# Altium footprint library CeleronLib_SMD.PcbLib: 198 footprints (part 11 of 13)
Each footprint in its own frame and in the unit in brackets; x right, y up, seen from the top. Pads: shape width x height; smd on the part's side, far side on the other; paste and mask are expansions set on the pad; w line width, h text height; cw(c..) or ccw(c..) is an arc to the next point about the centre after c.
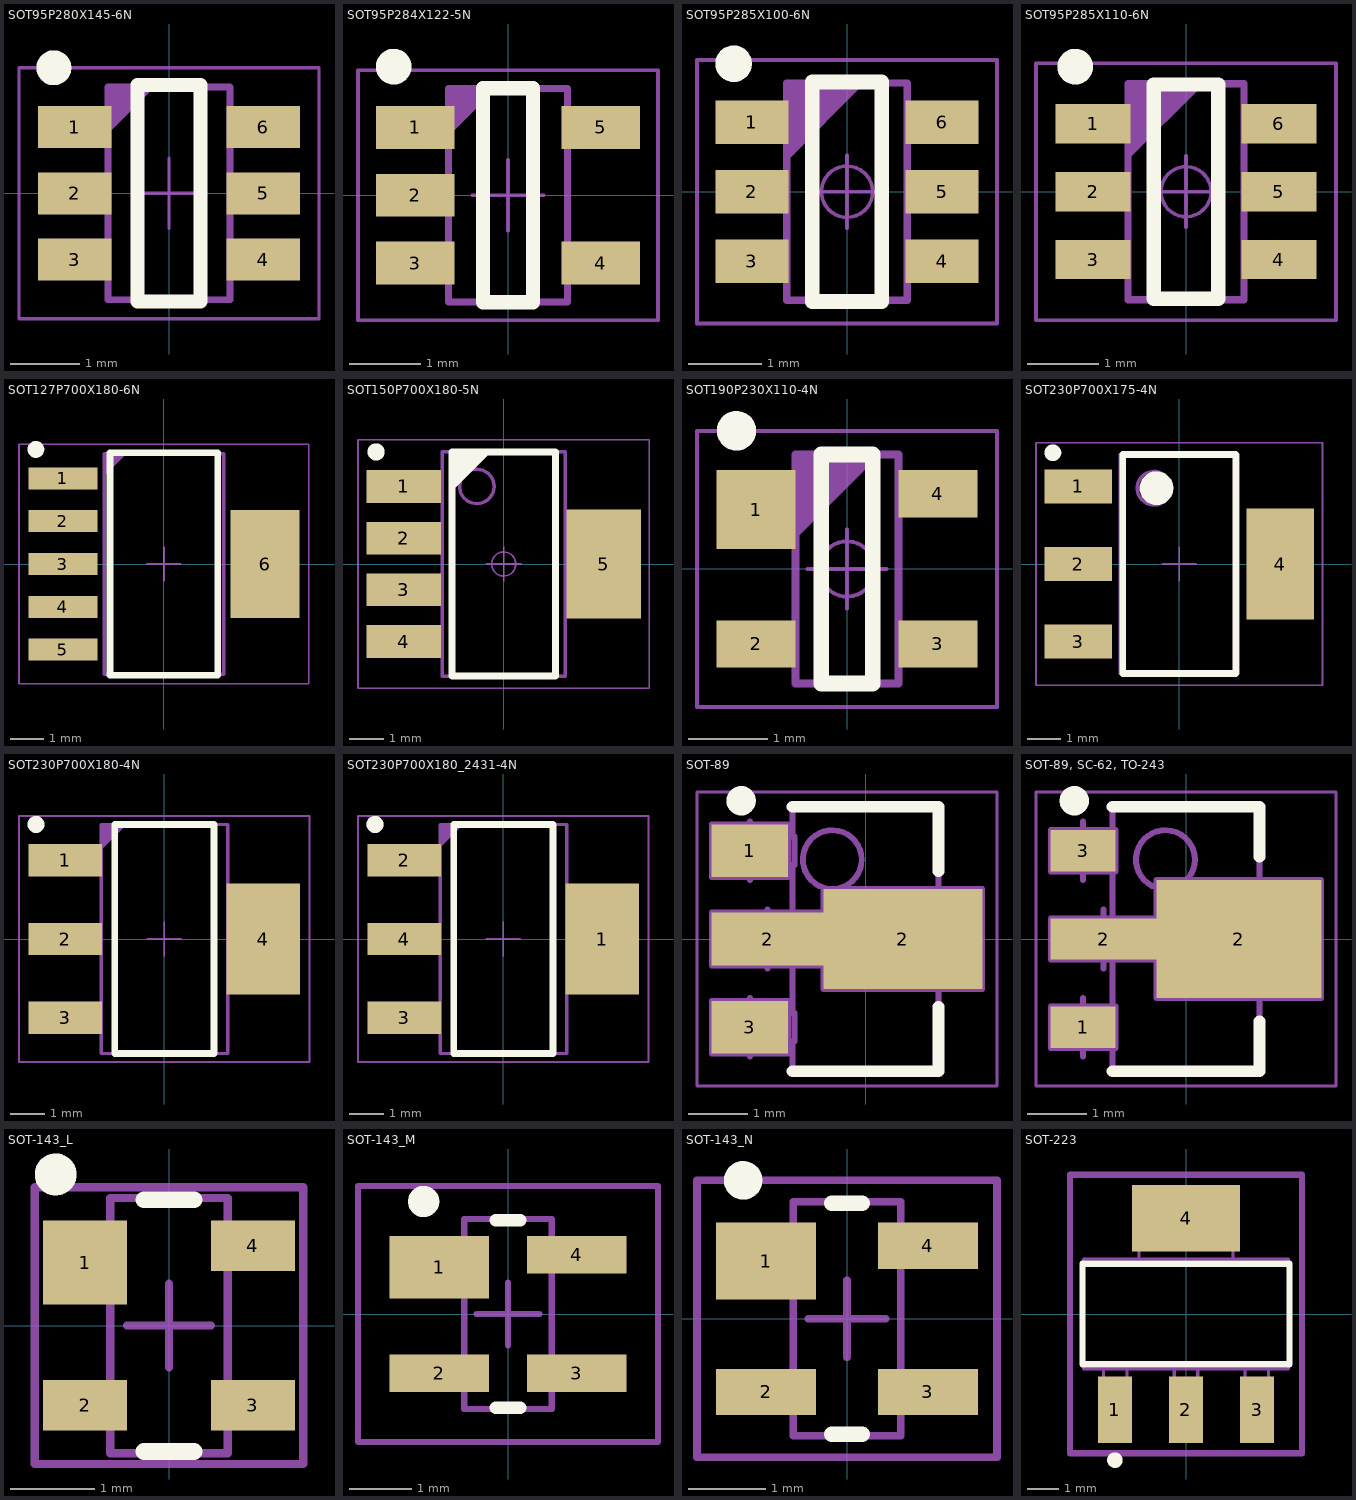
[diagram p10: the footprints below, top view; thin cyan lines are the x and y axes]

## SOT95P280X145-6N [mm] "SOT23, 6-Leads, Body 1.6x3.0mm, Pitch 0.95mm, IPC Medium Density"
height 1.45
pads (6):
  rect 1.05x0.6 smd: 1(-1.35,0.95) 2(-1.35,0) 3(-1.35,-0.95) 4(1.35,-0.95) 5(1.35,0) 6(1.35,0.95)
Top Overlay:
  circle w0.25: c-1.65,1.8 r0.125
  lines w0.2: -0.45,-1.55 0.45,-1.55 0.45,1.55 -0.45,1.55 -0.45,-1.55
Top Assy:
  lines w0.1: -0.875,0.925 -0.275,1.525 ; -0.875,1.025 -0.375,1.525 ; -0.875,1.125 -0.475,1.525 ; -0.875,1.225 -0.575,1.525 ; -0.875,1.325 -0.675,1.525 ; -0.875,1.425 -0.775,1.525 ; -0.875,-1.525 -0.875,1.525 0.875,1.525 0.875,-1.525 -0.875,-1.525
Top Courtyard:
  lines w0.05: -0.5,0 0.5,0 ; 0,-0.5 0,0.5 ; -2.15,-1.8 -2.15,1.8 2.15,1.8 2.15,-1.8 -2.15,-1.8
3D body: height 1.45, standoff 0, extent -1.4,-1.5 1.4,1.5

## SOT95P284X122-5N [mm] "SOT23 5, Pitch 0.95mm - Body 1.67x2.99mm, IPC Medium Density"
height 1.22
pads (5):
  rect 1.1x0.6 smd: 1(-1.3,0.95) 2(-1.3,0) 3(-1.3,-0.95) 4(1.3,-0.95) 5(1.3,0.95)
Top Overlay:
  circle w0.25: c-1.6,1.8 r0.125
  lines w0.2: -0.35,-1.5 -0.35,1.5 0.35,1.5 0.35,-1.5 -0.35,-1.5
Top Assy:
  lines w0.1: -0.835,0.895 -0.235,1.495 ; -0.835,0.995 -0.335,1.495 ; -0.835,1.095 -0.435,1.495 ; -0.835,1.195 -0.535,1.495 ; -0.835,1.295 -0.635,1.495 ; -0.835,1.395 -0.735,1.495 ; -0.835,-1.495 -0.835,1.495 0.835,1.495 0.835,-1.495 -0.835,-1.495
Top Courtyard:
  lines w0.05: -0.5,0 0.5,0 ; 0,-0.5 0,0.5 ; -2.1,-1.75 -2.1,1.75 2.1,1.75 2.1,-1.75 -2.1,-1.75
3D body: height 1.22, standoff 0, extent -1.44,-1.5 1.44,1.5

## SOT95P285X100-6N [mm] "SOT230, 0.95mm, pitch; 6 pin, 1.65mm W X 2.97mm L X 1.00mm H body IPC Medium Density"
height 1
pads (6):
  rect 1x0.6 smd: 1(-1.3,0.95) 2(-1.3,0) 3(-1.3,-0.95) 4(1.3,-0.95) 5(1.3,0) 6(1.3,0.95)
Top Overlay:
  circle w0.25: c-1.55,1.75 r0.125
  lines w0.2: -0.475,-1.5 -0.475,1.5 0.475,1.5 0.475,-1.5 -0.475,-1.5
Top Assy:
  lines w0.1: -0.825,0.485 0.175,1.485 ; -0.825,0.585 0.075,1.485 ; -0.825,0.685 -0.025,1.485 ; -0.825,0.785 -0.125,1.485 ; -0.825,0.885 -0.225,1.485 ; -0.825,0.985 -0.325,1.485 ; -0.825,1.085 -0.425,1.485 ; -0.825,1.185 -0.525,1.485 ; -0.825,1.285 -0.625,1.485 ; -0.825,1.385 -0.725,1.485 ; -0.825,-1.485 -0.825,1.485 0.825,1.485 0.825,-1.485 -0.825,-1.485
Top Courtyard:
  circle w0.05: c0,0 r0.35
  lines w0.05: -0.5,0 0.5,0 ; 0,-0.5 0,0.5 ; -2.05,-1.8 -2.05,1.8 2.05,1.8 2.05,-1.8 -2.05,-1.8
3D body: height 1, standoff 0, extent -1.4,-1.5 1.48,1.5

## SOT95P285X110-6N [mm] "SOT, 0.95mm, pitch; 6 pin,1.625mm W X 3.025mm L X 1.10mm H body, IPC Medium Density"
height 1.1
pads (6):
  rect 1.05x0.55 smd: 1(-1.3,0.95) 2(-1.3,0) 3(-1.3,-0.95) 4(1.3,-0.95) 5(1.3,0) 6(1.3,0.95)
Top Overlay:
  circle w0.25: c-1.55,1.75 r0.125
  lines w0.2: -0.45,-1.5 -0.45,1.5 0.45,1.5 0.45,-1.5 -0.45,-1.5
Top Assy:
  lines w0.1: -0.812,0.512 0.188,1.512 ; -0.812,0.612 0.088,1.512 ; -0.812,0.712 -0.012,1.512 ; -0.812,0.812 -0.112,1.512 ; -0.812,0.912 -0.212,1.512 ; -0.812,1.012 -0.312,1.512 ; -0.812,1.112 -0.412,1.512 ; -0.812,1.212 -0.512,1.512 ; -0.812,1.312 -0.612,1.512 ; -0.812,1.412 -0.712,1.512 ; -0.812,-1.512 -0.812,1.512 0.812,1.512 0.812,-1.512 -0.812,-1.512
Top Courtyard:
  circle w0.05: c0,0 r0.35
  lines w0.05: -0.5,0 0.5,0 ; 0,-0.5 0,0.5 ; -2.1,-1.8 -2.1,1.8 2.1,1.8 2.1,-1.8 -2.1,-1.8
3D body: height 1.1, standoff 0, extent -1.4,-1.5 1.48,1.5

## SOT127P700X180-6N [mm] "SOT223, 6-Leads, Body 6.6x7.3mm (max), Pitch 1.27mm, IPC Medium Density"
height 1.8
pads (6):
  rect 2.05x0.65 smd: 1(-3,2.54) 2(-3,1.27) 3(-3,0) 4(-3,-1.27) 5(-3,-2.54)
  rect 2.05x3.2 smd: 6(3,0)
Top Overlay:
  circle w0.25: c-3.8,3.4 r0.125
  lines w0.2: -1.6,-3.3 1.6,-3.3 1.6,3.3 -1.6,3.3 -1.6,-3.3
Top Assy:
  lines w0.1: -1.775,2.675 -1.175,3.275 ; -1.775,2.775 -1.275,3.275 ; -1.775,2.875 -1.375,3.275 ; -1.775,2.975 -1.475,3.275 ; -1.775,3.075 -1.575,3.275 ; -1.775,3.175 -1.675,3.275 ; -1.775,-3.275 1.775,-3.275 1.775,3.275 -1.775,3.275 -1.775,-3.275
Top Courtyard:
  lines w0.05: -0.5,0 0.5,0 ; 0,-0.5 0,0.5 ; -4.3,-3.55 4.3,-3.55 4.3,3.55 -4.3,3.55 -4.3,-3.55
3D body: height 1.8, standoff 0, extent -3.683,-3.275 3.683,3.275

## SOT150P700X180-5N [mm] "SOT223, SOT,1.50mm pitch; 5 pin, 3.56mm W X 6.50mm L X 1.80mm H body, IPC Medium Density"
height 1.8
pads (5):
  rect 2.15x0.95 smd: 1(-2.9,2.25) 2(-2.9,0.75) 3(-2.9,-0.75) 4(-2.9,-2.25)
  rect 2.15x3.15 smd: 5(2.9,0)
Top Overlay:
  circle w0.25: c-3.7,3.25 r0.125
  lines w0.2: -1.5,2.25 -0.5,3.25 ; -1.5,2.45 -0.7,3.25 ; -1.5,2.65 -0.9,3.25 ; -1.5,2.85 -1.1,3.25 ; -1.5,3.05 -1.3,3.25 ; -1.5,-3.25 -1.5,3.25 1.5,3.25 1.5,-3.25 -1.5,-3.25
Top Assy:
  circle w0.1: c-0.78,2.25 r0.5
  lines w0.1: -1.78,-3.25 -1.78,3.25 1.78,3.25 1.78,-3.25 -1.78,-3.25
Top Courtyard:
  circle w0.05: c0,0 r0.35
  lines w0.05: -0.5,0 0.5,0 ; 0,-0.5 0,0.5 ; -4.225,-3.6 -4.225,3.6 4.225,3.6 4.225,-3.6 -4.225,-3.6
3D body: height 1.8, standoff 0, extent -3.683,-3.275 3.683,3.275

## SOT190P230X110-4N [mm] "SOT143, SOT, 1.90mm Pitch; 4 Pin, 1.30mm W X 2.90mm L X 1.10mm H body, IPC Medium Density"
height 1.1
pads (4):
  rect 1x1 smd: 1(-1.15,0.75)
  rect 1x0.6 smd: 2(-1.15,-0.95) 3(1.15,-0.95) 4(1.15,0.95)
Top Overlay:
  circle w0.25: c-1.4,1.75 r0.125
  lines w0.2: -0.325,-1.45 -0.325,1.45 0.325,1.45 0.325,-1.45 -0.325,-1.45
Top Assy:
  lines w0.1: -0.65,0.45 0.35,1.45 ; -0.65,0.55 0.25,1.45 ; -0.65,0.65 0.15,1.45 ; -0.65,0.75 0.05,1.45 ; -0.65,0.85 -0.05,1.45 ; -0.65,0.95 -0.15,1.45 ; -0.65,1.05 -0.25,1.45 ; -0.65,1.15 -0.35,1.45 ; -0.65,1.25 -0.45,1.45 ; -0.65,1.35 -0.55,1.45 ; -0.65,-1.45 -0.65,1.45 0.65,1.45 0.65,-1.45 -0.65,-1.45
Top Courtyard:
  circle w0.05: c0,0 r0.35
  lines w0.05: -0.5,0 0.5,0 ; 0,-0.5 0,0.5 ; -1.9,-1.75 -1.9,1.75 1.9,1.75 1.9,-1.75 -1.9,-1.75
3D body: height 1.1, standoff 0, extent -1.25,-1.5 1.25,1.5

## SOT230P700X175-4N [mm] "SOT223, 2.30mm pitch; 3 pin, 3.70mm W X 6.70mm L, IPC Medium Density"
height 1.75
pads (4):
  rect 2x1 smd: 1(-3,2.3) 2(-3,0) 3(-3,-2.3)
  rect 2x3.3 smd: 4(3,0)
Top Overlay:
  circle w0.25: c-3.75,3.3 r0.125
  circle w0.5: c-0.675,2.25 r0.25
  lines w0.2: -1.675,-3.25 -1.675,3.25 1.675,3.25 1.675,-3.25 -1.675,-3.25
Top Assy:
  circle w0.1: c-0.75,2.25 r0.5
  lines w0.1: -1.75,-3.25 -1.75,3.25 1.75,3.25 1.75,-3.25 -1.75,-3.25
Top Courtyard:
  lines w0.05: -0.5,0 0.5,0 ; 0,-0.5 0,0.5 ; -4.25,-3.6 -4.25,3.6 4.25,3.6 4.25,-3.6 -4.25,-3.6
3D body: height 1.75, standoff 0, extent -3.649,-3.35 3.649,3.35

## SOT230P700X180-4N [mm] "SOT223, 2.30mm pitch; 3 pin, 3.70mm W X 6.70mm L, IPC Medium Density"
height 1.8
pads (4):
  rect 2.15x0.95 smd: 1(-2.9,2.3) 2(-2.9,0) 3(-2.9,-2.3)
  rect 2.15x3.25 smd: 4(2.9,0)
Top Overlay:
  circle w0.25: c-3.75,3.35 r0.125
  lines w0.2: -1.45,-3.35 -1.45,3.35 1.45,3.35 1.45,-3.35 -1.45,-3.35
Top Assy:
  lines w0.1: -1.85,2.675 -1.175,3.35 ; -1.85,2.75 -1.25,3.35 ; -1.85,2.85 -1.35,3.35 ; -1.85,2.95 -1.45,3.35 ; -1.85,3.05 -1.55,3.35 ; -1.85,3.15 -1.65,3.35 ; -1.85,3.25 -1.75,3.35 ; -1.85,-3.35 -1.85,3.35 1.85,3.35 1.85,-3.35 -1.85,-3.35
Top Courtyard:
  lines w0.05: -0.5,0 0.5,0 ; 0,-0.5 0,0.5 ; -4.25,-3.6 -4.25,3.6 4.25,3.6 4.25,-3.6 -4.25,-3.6
3D body: height 1.81, standoff 0, extent -3.649,-3.35 3.649,3.35

## SOT230P700X180_2431-4N [mm] "SOT223; 2,4,3,1 Pin Order , 2.30mm pitch; 3 pin, 3.70mm W X 6.70mm L, IPC Medium Density"
height 1.8
pads (4):
  rect 2.15x3.25 smd: 1(2.9,0)
  rect 2.15x0.95 smd: 2(-2.9,2.3) 3(-2.9,-2.3) 4(-2.9,0)
Top Overlay:
  circle w0.25: c-3.75,3.35 r0.125
  lines w0.2: -1.45,-3.35 1.45,-3.35 1.45,3.35 -1.45,3.35 -1.45,-3.35
Top Assy:
  circle w0.25: c-3.75,3.35 r0.125
  lines w0.1: -1.85,2.75 -1.25,3.35 ; -1.85,2.85 -1.35,3.35 ; -1.85,2.95 -1.45,3.35 ; -1.85,3.05 -1.55,3.35 ; -1.85,3.15 -1.65,3.35 ; -1.85,3.25 -1.75,3.35 ; -1.85,-3.35 1.85,-3.35 1.85,3.35 -1.85,3.35 -1.85,-3.35
Top Courtyard:
  lines w0.05: -0.5,0 0.5,0 ; 0,-0.5 0,0.5 ; -4.25,-3.6 4.25,-3.6 4.25,3.6 -4.25,3.6 -4.25,-3.6
3D body: height 1.81, standoff 0, extent -3.649,-3.35 3.649,3.35

## SOT-89 [mm] "SOT89-3, 3-Leads, Body 2.48x4.5mm"
height 1.6
pads (4):
  rect 1.3x0.9 smd: 1(-1.965,1.5) 3(-1.965,-1.5)
  rect 1.9x0.9 smd: 2(-1.665,0)
  rect 2.7x1.7 smd: 2(0.635,0)
Top Overlay:
  circle w0.25: c-2.115,2.35 r0.125
  lines w0.2: -1.24,-2.25 1.24,-2.25 1.24,-1.15 ; -1.24,2.25 1.24,2.25 1.24,1.15
Mechanical 8:
  lines w0.1: -2.465,-1.5 -1.965,-1.5 ; -2.465,1.5 -1.965,1.5 ; -2.165,0 -1.665,0 ; -1.965,-2 -1.965,-1.5 ; -1.965,-1 -1.965,-1.5 ; -1.965,1 -1.965,1.5 ; -1.965,2 -1.965,1.5 ; -1.665,-0.5 -1.665,0 ; -1.665,0.5 -1.665,0 ; -1.465,-1.5 -1.965,-1.5 ; -1.465,1.5 -1.965,1.5 ; -1.165,0 -1.665,0 ; -0.5,0 0,0 ; 0,-0.5 0,0 ; 0,0.5 0,0 ; 0.635,-0.5 0.635,0 ; 0.635,0.5 0.635,0 ; 1.135,0 0.635,0 ; -2.615,-1.95 -2.615,-1.05 -1.315,-1.05 -1.315,-1.95 -2.615,-1.95 ; -2.615,-0.45 -0.715,-0.45 -0.715,-0.85 1.985,-0.85 1.985,0.85 -0.715,0.85 -0.715,0.45 -2.615,0.45 -2.615,-0.45 ; -2.615,1.05 -2.615,1.95 -1.315,1.95 -1.315,1.05 -2.615,1.05
Top Assy:
  circle w0.1: c-0.565,1.35 r0.5
  lines w0.1: -1.24,-1.74 -1.24,-2.25 1.24,-2.25 1.24,-0.8 ; -1.24,-1.26 -1.24,-0.24 ; -1.24,0.24 -1.24,1.26 ; -1.24,1.74 -1.24,2.25 1.24,2.25 1.24,0.8 ; -2.44,-1.74 -1.206,-1.74 -1.206,-1.26 -2.44,-1.26 -2.44,-1.74 ; -2.44,-0.24 -1.206,-0.24 -1.206,0.24 -2.44,0.24 -2.44,-0.24 ; -2.44,1.26 -1.206,1.26 -1.206,1.74 -2.44,1.74 -2.44,1.26 ; 1.206,-0.8 1.61,-0.8 ccw(c1.61,-0.6) 1.81,-0.6 1.81,0.6 ccw(c1.61,0.6) 1.61,0.8 1.206,0.8 1.206,-0.8
Top Courtyard:
  lines w0.05: -2.865,-2.5 -2.865,2.5 2.235,2.5 2.235,-2.5 -2.865,-2.5
3D body: height 1.6, standoff 0, extent -2.44,-2.25 1.81,2.25

## SOT-89, SC-62, TO-243 [mm] "SOT89, (SC-62), TO-243, 3-Leads, Body 2.5x4.5mm"
height 1.2
pads (4):
  rect 1.1x0.7 smd: 1(-1.75,-1.5) 3(-1.75,1.5)
  rect 1.8x0.7 smd: 2(-1.4,0)
  rect 2.8x2 smd: 2(0.9,0)
Top Overlay:
  circle w0.25: c-1.9,2.35 r0.125
  lines w0.2: -1.25,-2.25 1.25,-2.25 1.25,-1.4 ; -1.25,2.25 1.25,2.25 1.25,1.4
Mechanical 8:
  lines w0.1: -2.25,-1.5 -1.75,-1.5 ; -2.25,1.5 -1.75,1.5 ; -1.9,0 -1.4,0 ; -1.75,-2 -1.75,-1.5 ; -1.75,-1 -1.75,-1.5 ; -1.75,1 -1.75,1.5 ; -1.75,2 -1.75,1.5 ; -1.4,-0.5 -1.4,0 ; -1.4,0.5 -1.4,0 ; -1.25,-1.5 -1.75,-1.5 ; -1.25,1.5 -1.75,1.5 ; -0.9,0 -1.4,0 ; -0.5,0 0,0 ; 0,-0.5 0,0 ; 0,0.5 0,0 ; 0.4,0 0.9,0 ; 0.5,0 0,0 ; 0.9,-0.5 0.9,0 ; 0.9,0.5 0.9,0 ; 1.4,0 0.9,0 ; -2.3,-1.85 -1.2,-1.85 -1.2,-1.15 -2.3,-1.15 -2.3,-1.85 ; -2.3,-0.35 -0.5,-0.35 -0.5,-1 2.3,-1 2.3,1 -0.5,1 -0.5,0.35 -2.3,0.35 -2.3,-0.35 ; -2.3,1.15 -1.2,1.15 -1.2,1.85 -2.3,1.85 -2.3,1.15
Top Assy:
  circle w0.1: c-0.35,1.35 r0.5
  lines w0.1: -1.25,-1.707 -1.25,-1.293 ; -1.25,1.293 -1.25,1.707 ; -1.25,-2.25 -1.25,2.25 1.25,2.25 1.25,-2.25 -1.25,-2.25
Top Courtyard:
  lines w0.05: -2.55,-2.5 -2.55,2.5 2.55,2.5 2.55,-2.5 -2.55,-2.5
3D body: height 1.6, standoff 0, extent -2.25,-2.25 2.25,2.25

## SOT-143_L [mm] "SOT143, 4-Leads, Body 2.9x1.3mm, Pitch 1.9mm, Lead Span 2.5mm, IPC High Density"
height 1.1
pads (4):
  rect 1x1 smd: 1(-1,0.75)
  rect 1x0.6 smd: 2(-1,-0.95) 3(1,-0.95) 4(1,0.95)
Top Overlay:
  circle w0.25: c-1.35,1.8 r0.125
  lines w0.2: -0.3,-1.5 0.3,-1.5 ; -0.3,1.5 0.3,1.5
Top Assy:
  lines w0.1: -0.7,-1.52 0.7,-1.52 0.7,1.52 -0.7,1.52 -0.7,-1.52
Top Courtyard:
  lines w0.1: -0.5,0 0.5,0 ; 0,-0.5 0,0.5 ; -1.6,-1.65 1.6,-1.65 1.6,1.65 -1.6,1.65 -1.6,-1.65
3D body: height 1.1, standoff 0, extent -1.25,-1.5 1.25,1.5

## SOT-143_M [mm] "SOT143, 4-Leads, Body 2.9x1.3mm, Pitch 1.9mm, Lead Span 2.5mm, IPC Low Density"
height 1.1
pads (4):
  rect 1.6x1 smd: 1(-1.1,0.75)
  rect 1.6x0.6 smd: 2(-1.1,-0.95) 3(1.1,-0.95) 4(1.1,0.95)
Top Overlay:
  circle w0.25: c-1.35,1.8 r0.125
  lines w0.2: -0.2,-1.5 0.2,-1.5 ; -0.2,1.5 0.2,1.5
Top Assy:
  lines w0.1: -0.7,-1.52 -0.7,1.52 0.7,1.52 0.7,-1.52 -0.7,-1.52
Top Courtyard:
  lines w0.1: -0.5,0 0.5,0 ; 0,-0.5 0,0.5 ; -2.4,-2.05 -2.4,2.05 2.4,2.05 2.4,-2.05 -2.4,-2.05
3D body: height 1.1, standoff 0, extent -1.275,-1.5 1.225,1.5

## SOT-143_N [mm] "SOT143, 4-Leads, Body 2.9x1.3mm, Pitch 1.9mm, Lead Span 2.5mm, IPC Medium Density"
height 1.1
pads (4):
  rect 1.3x1 smd: 1(-1.05,0.75)
  rect 1.3x0.6 smd: 2(-1.05,-0.95) 3(1.05,-0.95) 4(1.05,0.95)
Top Overlay:
  circle w0.25: c-1.35,1.8 r0.125
  lines w0.2: -0.2,-1.5 0.2,-1.5 ; -0.2,1.5 0.2,1.5
Top Assy:
  lines w0.1: -0.7,-1.52 -0.7,1.52 0.7,1.52 0.7,-1.52 -0.7,-1.52
Top Courtyard:
  lines w0.1: -0.5,0 0.5,0 ; 0,-0.5 0,0.5 ; -1.95,-1.8 -1.95,1.8 1.95,1.8 1.95,-1.8 -1.95,-1.8
3D body: height 1.1, standoff 0, extent -1.25,-1.5 1.25,1.5

## SOT-223 [mm] "SOT-223/SC-73; 4 Leads; Body 6.7 x 7.3 mm, inc. leads (LxW max)"
height 1.8
pads (4):
  rect 1.1x2.15 smd: 1(-2.3,-3.1) 2(0,-3.1) 3(2.3,-3.1)
  rect 3.5x2.15 smd: 4(0,3.1)
Top Overlay:
  circle w0.25: c-2.3,-4.725 r0.125
  lines w0.2: -3.35,-1.625 3.35,-1.625 3.35,1.625 -3.35,1.625 -3.35,-1.625
Top 3D:
  lines w0.1: -2.667,-1.778 -2.667,-3.556 -1.905,-3.556 -1.905,-1.778 ; -1.524,1.778 -1.524,3.556 1.524,3.556 1.524,1.778 ; -0.381,-1.778 -0.381,-3.556 0.381,-3.556 0.381,-1.778 ; 1.905,-1.778 1.905,-3.556 2.667,-3.556 2.667,-1.778 ; -3.315,-1.778 -3.315,1.778 3.316,1.778 3.316,-1.778 -3.315,-1.778
Top Courtyard:
  lines w0.2: -3.75,-4.5 -3.75,4.5 3.75,4.5 3.75,-4.5 -3.75,-4.5
3D body: height 1.8, standoff 0, extent -3.315,-1.777 3.316,1.778
3D body: height 0.2, standoff 0, extent -2.666,-3.555 -1.906,-1.779
3D body: height 0.2, standoff 0, extent -1.523,1.779 1.523,3.555
3D body: height 0.2, standoff 0, extent -0.38,-3.555 0.38,-1.779
3D body: height 0.2, standoff 0, extent 1.906,-3.555 2.666,-1.779